# Altium footprint library Devkit.PcbLib: 84 footprints (part 3 of 6)
Each footprint in its own frame and in the unit in brackets; x right, y up, seen from the top. Pads: shape width x height; smd on the part's side, far side on the other; paste and mask are expansions set on the pad; w line width, h text height; cw(c..) or ccw(c..) is an arc to the next point about the centre after c.
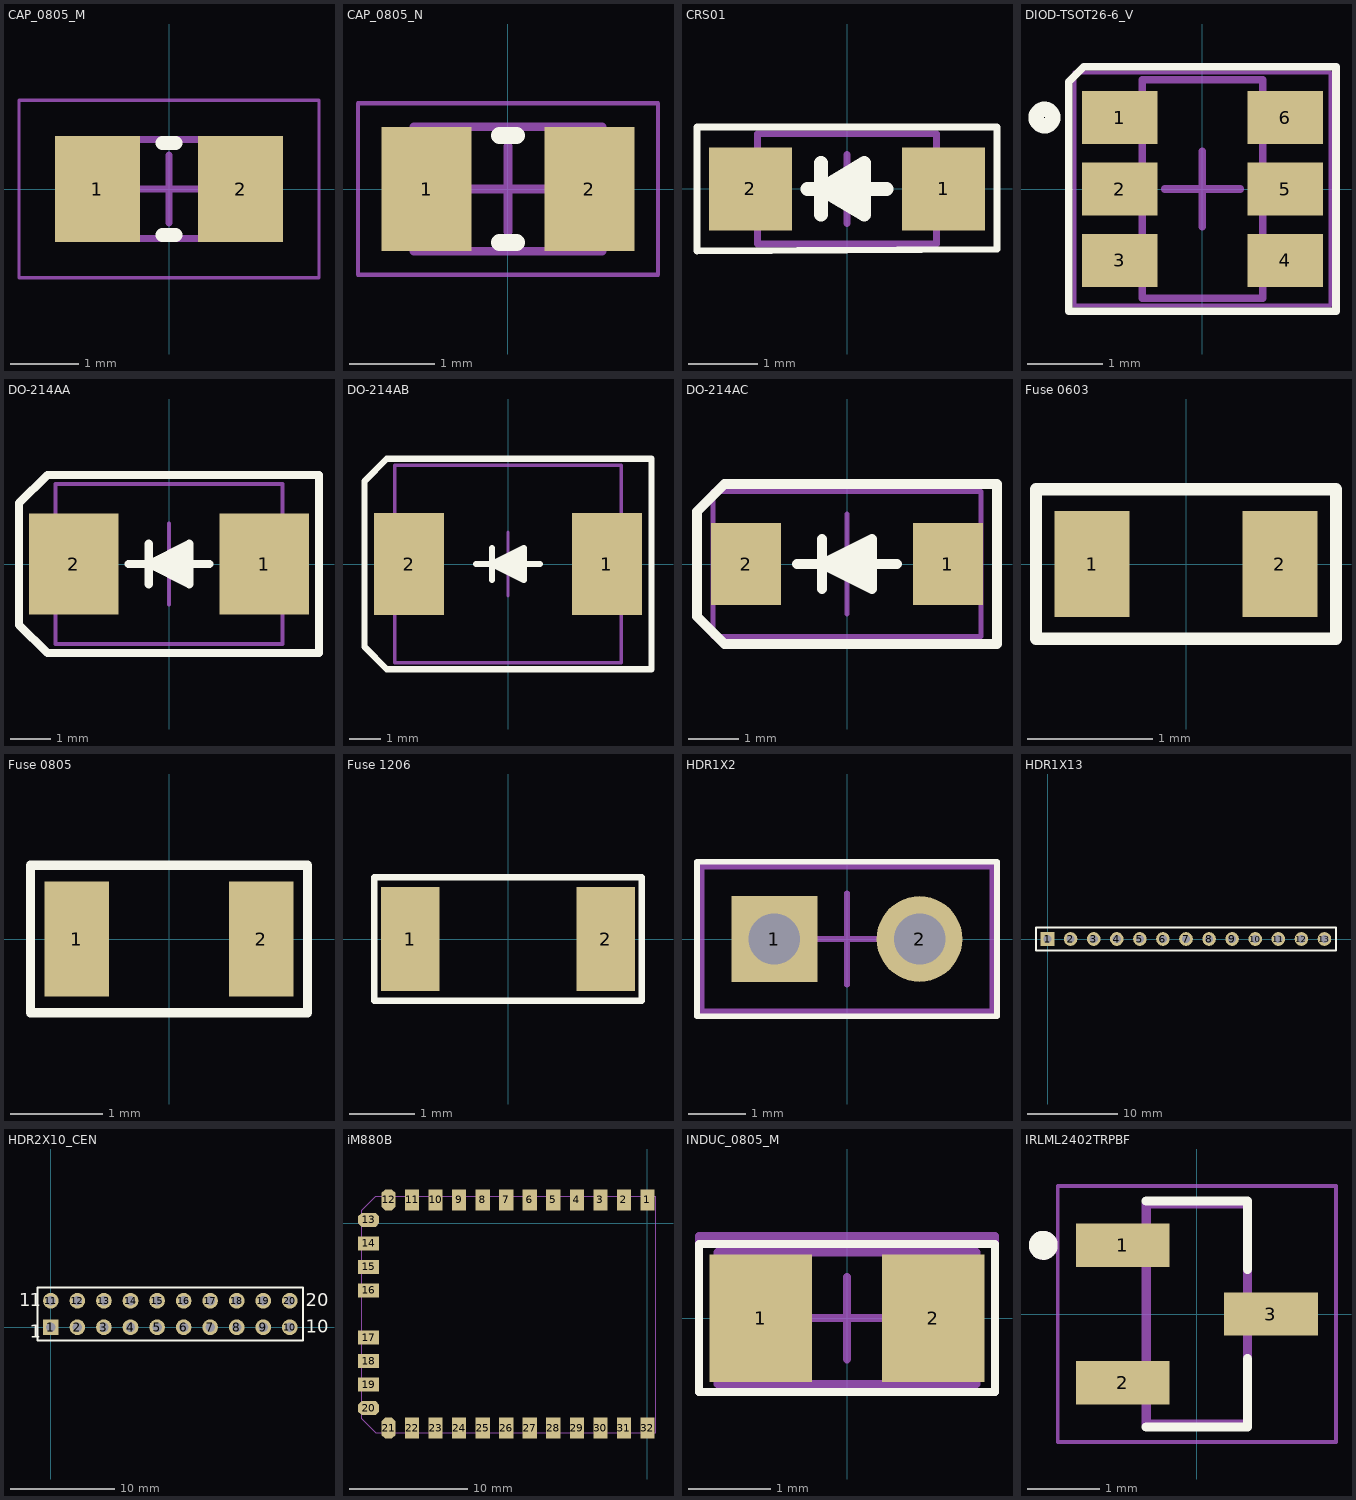
[diagram p2: the footprints below, top view; thin cyan lines are the x and y axes]

## CAP_0805_M [mm] "Chip Capacitor, Body 2.0x1.2mm, Height 1.45mm, IPC Low Density"
height 1.45
pads (2):
  rect 1.25x1.55 smd: 1(-1.05,0) 2(1.05,0)
Top Overlay:
  lines w0.2: -0.1,-0.675 0.1,-0.675 ; -0.1,0.675 0.1,0.675
Mechanical 13:
  lines w0.1: -1.1,-0.725 -1.1,0.725 1.1,0.725 1.1,-0.725 -1.1,-0.725
Mechanical 15:
  lines w0.05: -2.2,-1.3 -2.2,1.3 2.2,1.3 2.2,-1.3 -2.2,-1.3
  lines w0.1: -0.5,0 0.5,0 ; 0,-0.5 0,0.5
3D body: height 1.45, standoff 0, extent -0.6,-0.725 0.6,0.725
3D body: height 1.45, standoff 0, extent -1.1,-0.725 -0.6,0.725
3D body: height 1.45, standoff 0, extent 0.6,-0.725 1.1,0.725

## CAP_0805_N [mm] "Chip Capacitor, Body 2.0x1.2mm, Height 1.45mm, IPC Medium Density"
height 1.45
pads (2):
  rect 1.05x1.45 smd: 1(-0.95,0) 2(0.95,0)
Top Overlay:
  lines w0.2: -0.1,-0.625 0.1,-0.625 ; -0.1,0.625 0.1,0.625
Mechanical 13:
  lines w0.1: -1.1,-0.725 -1.1,0.725 1.1,0.725 1.1,-0.725 -1.1,-0.725
Mechanical 15:
  lines w0.05: -1.75,-1 -1.75,1 1.75,1 1.75,-1 -1.75,-1
  lines w0.1: -0.5,0 0.5,0 ; 0,-0.5 0,0.5
3D body: height 1.45, standoff 0, extent -0.6,-0.725 0.6,0.725
3D body: height 1.45, standoff 0, extent -1.1,-0.725 -0.6,0.725
3D body: height 1.45, standoff 0, extent 0.6,-0.725 1.1,0.725

## CRS01 [mm]
pads (2):
  rect 1.2x1.2 smd: 1(1.4,0) 2(-1.4,0)
Top Overlay:
  lines w0.1: -2.175,-0.903 2.175,-0.875 2.175,0.9 -2.175,0.9 -2.175,-0.903
  lines w0.2: -0.575,0 0.575,0 ; -0.375,-0.375 -0.375,0.375 ; 0,0 0.25,0.375 ; 0,0 0.25,0.375 ; 0,0 0.25,-0.375 ; 0.25,-0.375 0.25,0.375 ; 0.25,-0.375 -0.375,0 0.25,0.375
Mechanical 13:
  lines w0.1: -1.3,-0.8 -1.3,0.8 1.3,0.8 1.3,-0.8 -1.3,-0.8
Mechanical 15:
  lines w0.1: -0.5,0 0.5,0 ; 0,-0.5 0,0.5 ; -1.3,-0.8 -1.3,0.8 1.3,0.8 1.3,-0.8 -1.3,-0.8
3D body "User Library-TUMD2.STEP": height 0.81, standoff 0, extent -1.255,-0.65 1.245,0.65

## DIOD-TSOT26-6_V [mm] "SOT23, 6-Leads, Body 2.90x2.80mm, Pitch 0.95mm"
height 1
pads (6):
  rect 1x0.7 smd: 1(-1.099,0.95) 2(-1.099,0) 3(-1.099,-0.95) 4(1.099,-0.95) 5(1.099,0) 6(1.099,0.95)
Top Overlay:
  circle w0.2: c-2.1,0.95 r0.112
  lines w0.1: -1.775,-1.625 1.775,-1.625 1.775,1.625 -1.575,1.625 -1.775,1.425 -1.775,-1.625
Mechanical 13:
  lines w0.1: -0.8,-1.45 0.8,-1.45 0.8,1.45 -0.8,1.45 -0.8,-1.45
Mechanical 15:
  lines w0.05: -1.699,-1.55 1.7,-1.55 1.7,1.55 -1.699,1.55 -1.699,-1.55
  lines w0.1: -0.5,0 0.5,0 ; 0,-0.5 0,0.5
3D body "SOT95P280X100-6L.step": height 1, standoff 0, extent -1.4,-1.45 1.4,1.45

## DO-214AA [mm]
pads (2):
  rect 2.2x2.5 smd: 1(2.35,0) 2(-2.35,0)
Top Overlay:
  lines w0.2: -1,0 1,0 ; -0.5,-0.5 -0.5,0.5 ; 0.225,-0.15 0.5,-0.5 ; 0.225,0.15 0.5,0.5 ; -0.3,0 0.4,-0.3 ; -0.3,0 0.4,0.3 ; -0.3,0 0.4,0 0.4,0.3 ; 0.4,-0.3 0.4,0.3 ; 0.4,-0.3 0.05,0 0.4,0.3 ; 0.5,-0.5 0.5,0.5 ; 0.5,-0.5 -0.5,0 0.5,0.5 ; -3.7,-1.5 -3,-2.2 3.7,-2.2 3.7,2.2 -3,2.2 -3.7,1.5 -3.7,-1.5
Mechanical 2:
  lines w0.1: -2.8,-1.975 2.8,-1.975 2.8,1.975 -2.8,1.975 -2.8,-1.975
Mechanical 15:
  lines w0.1: -1,0 1,0 ; 0,-1 0,1 ; -2.8,-1.975 2.8,-1.975 2.8,1.975 -2.8,1.975 -2.8,-1.975
3D body "User Library-DIOM5539X24.STEP": height 2.45, standoff 0.03, extent -2.75,-1.95 2.75,1.95

## DO-214AB [mm]
pads (2):
  rect 2.2x3.2 smd: 1(3.105,0) 2(-3.105,0)
Top Overlay:
  lines w0.2: -1,0 1,0 ; -0.5,-0.5 -0.5,0.5 ; 0.225,-0.15 0.5,-0.5 ; 0.225,0.15 0.5,0.5 ; -0.3,0 0.4,0 0.4,0.3 ; -0.3,0 0.4,0.3 ; -0.3,0 0.4,-0.3 ; 0.4,-0.3 0.05,0 0.4,0.3 ; 0.4,-0.3 0.4,0.3 ; 0.5,-0.5 -0.5,0 0.5,0.5 ; 0.5,-0.5 0.5,0.5 ; -4.5,-2.6 -4.5,2.6 -3.8,3.3 4.5,3.3 4.5,-3.3 -3.8,-3.3 -4.5,-2.6
Mechanical 2:
  lines w0.1: -3.55,-3.1 -3.55,3.1 3.55,3.1 3.55,-3.1 -3.55,-3.1
Mechanical 15:
  lines w0.1: -1,0 1,0 ; 0,-1 0,1 ; -3.55,-3.1 -3.55,3.1 3.55,3.1 3.55,-3.1 -3.55,-3.1
3D body "User Library-DO-214AB-SMC.STEP": height 2.5, standoff 0.05, extent -3.9,-2.95 3.9,2.95

## DO-214AC [mm]
pads (2):
  rect 1.4x1.64 smd: 1(2.015,0) 2(-2.015,0)
Top Overlay:
  lines w0.2: -1,0 1,0 ; -0.5,-0.5 -0.5,0.5 ; 0.225,-0.15 0.5,-0.5 ; 0.225,0.15 0.5,0.5 ; -0.3,0 0.4,0 0.4,0.3 ; -0.3,0 0.4,0.3 ; -0.3,0 0.4,-0.3 ; 0.4,-0.3 0.05,0 0.4,0.3 ; 0.4,-0.3 0.4,0.3 ; 0.5,-0.5 -0.5,0 0.5,0.5 ; 0.5,-0.5 0.5,0.5 ; -3,-1.05 -3,1.05 -2.45,1.6 3,1.6 3,-1.6 -2.45,-1.6 -3,-1.05
Mechanical 2:
  lines w0.1: -2.675,-1.45 -2.675,1.45 2.675,1.45 2.675,-1.45 -2.675,-1.45
Mechanical 15:
  lines w0.05: -2.675,-1.45 -2.675,1.45 2.675,1.45 2.675,-1.45 -2.675,-1.45
  lines w0.1: -1,0 1,0 ; 0,-1 0,1
3D body "User Library-DO-214AC(SMA).STEP": height 2.24, standoff -0.04, extent -2.743,-1.397 2.743,1.397

## Fuse 0603 [mm]
height 0.45
pads (2):
  rect 0.6x0.85 smd: 1(-0.75,0) 2(0.75,0)
Top Overlay:
  lines w0.1: -1.2,-0.6 1.2,-0.6 1.2,0.6 -1.2,0.6 -1.2,-0.6
3D body "SMD F-0603.STEP": height 0.45, standoff -0.01, extent -0.8,-0.4 0.8,0.4

## Fuse 0805 [mm]
height 0.55
pads (2):
  rect 0.7x1.25 smd: 1(-1,0) 2(1,0)
Top Overlay:
  lines w0.1: -1.5,-0.8 -1.5,0.8 1.5,0.8 1.5,-0.8 -1.5,-0.8
3D body "SMD F-0805.STEP": height 0.6, standoff 0, extent -1,-0.625 1,0.625

## Fuse 1206 [mm]
height 0.55
pads (2):
  rect 0.9x1.6 smd mask+0.102: 1(-1.5,0) 2(1.5,0)
Top Overlay:
  lines w0.1: -2.05,-0.95 -2.05,0.95 2.05,0.95 2.05,-0.95 -2.05,-0.95
3D body "SMD F-1206.STEP": height 0.6, standoff 0, extent -1.6,-0.8 1.6,0.8

## HDR1X2 [mm] "Connector; Header; 2 Position"
pads (2):
  rect 1.5x1.5 hole 0.9: 1(-1.27,0)
  round 1.5 hole 0.9: 2(1.27,0)
Top Overlay:
  lines w0.1: -2.625,-1.35 -2.625,1.35 2.625,1.35 2.625,-1.35 -2.625,-1.35
Mechanical 15:
  lines w0.1: -0.8,0 0.8,0 ; 0,-0.8 0,0.8 ; -2.54,-1.27 2.54,-1.27 2.54,1.27 -2.54,1.27 -2.54,-1.27
3D body "jumper.STEP": height 18.28, standoff -3, extent -2.54,-1.25 2.54,1.25

## HDR1X13 [mm] "Connector; Header; 11 Position"
pads (13):
  rect 1.5x1.5 hole 0.9: 1(0,0)
  round 1.5 hole 0.9: 2(2.54,0) 3(5.08,0) 4(7.62,0) 5(10.16,0) 6(12.7,0) 7(15.24,0) 8(17.78,0) 9(20.32,0) 10(22.86,0) 11(25.4,0) 12(27.94,0) 13(30.48,0)
Top Overlay:
  lines w0.2: -1.27,-1.27 31.75,-1.27 31.75,1.27 0.635,1.27 -1.27,1.27 -1.27,-1.27
3D body "Header, Male, 2.54mm, 1x10 (1).STEP": height 8.54, standoff -3, extent -1.27,-1.27 24.13,1.27
3D body "Header, Male, 2.54mm, 1x3 (1).STEP": height 8.54, standoff -3, extent 24.13,-1.27 31.75,1.27

## HDR2X10_CEN [mm] "Connector; Header; 10x2 Position"
pads (20):
  rect 1.5x1.5 hole 0.9: 1(0,0)
  round 1.5 hole 0.9: 2(2.54,0) 3(5.08,0) 4(7.62,0) 5(10.16,0) 6(12.7,0) 7(15.24,0) 8(17.78,0) 9(20.32,0) 10(22.86,0) 11(0,2.54) 12(2.54,2.54) 13(5.08,2.54) 14(7.62,2.54) 15(10.16,2.54) 16(12.7,2.54) 17(15.24,2.54) 18(17.78,2.54) 19(20.32,2.54) 20(22.86,2.54)
Top Overlay:
  lines w0.2: -1.27,-1.27 -1.27,3.81 24.13,3.81 24.13,-1.27 -1.27,-1.27
  text "20" at 24.384,2.032 h1.27
  text "10" at 24.384,-0.508 h1.27
  text "1" at -2.032,2.032 h1.27
  text "1" at -3.048,2.032 h1.27
  text "1" at -2.032,-1.016 h1.27
3D body "Header Female 1x10.STEP": height 8.59, standoff -3.29, extent -1.235,-1.205 24.765,1.27
3D body "Header Female 1x10.STEP": height 8.59, standoff -3.29, extent -1.235,1.303 24.765,3.777

## iM880B [mm]
pads (32):
  rect 1.2x1.8 smd: 1(0,2) 2(-2,2) 3(-4,2) 4(-6,2) 5(-8,2) 6(-10,2) 7(-12,2) 8(-14,2) 9(-16,2) 10(-18,2) 11(-20,2) 22(-20,-17.4) 23(-18,-17.4) 24(-16,-17.4) 25(-14,-17.4) 26(-12,-17.4) 27(-10,-17.4) 28(-8,-17.4) 29(-6,-17.4) 30(-4,-17.4) 31(-2,-17.4) 32(0,-17.4)
  oct 1.2x1.8 smd: 12(-22,2) 21(-22,-17.4)
  oct 1.8x1.2 smd: 13(-23.7,0.3) 20(-23.7,-15.7)
  rect 1.8x1.2 smd: 14(-23.7,-1.7) 15(-23.7,-3.7) 16(-23.7,-5.7) 17(-23.7,-9.7) 18(-23.7,-11.7) 19(-23.7,-13.7)
Mechanical 2:
  lines w0.1: -24.3,-16.6 -23.1,-17.8 0.7,-17.8 0.7,2.3 -23.1,2.3 -24.3,1.1 -24.3,-16.6
3D body: height 2, standoff 0, extent -24.3,-17.8 0.7,2.3

## INDUC_0805_M [mm]
pads (2):
  rect 1.25x1.55 smd: 1(-1.05,0) 2(1.05,0)
Top Overlay:
  lines w0.1: -1.8,-0.9 1.8,-0.9 1.8,0.9 -1.8,0.9 -1.8,-0.9
Mechanical 13:
  lines w0.1: -1.575,-0.8 1.575,-0.8 1.575,0.8 -1.575,0.8 -1.575,-0.8
Mechanical 15:
  lines w0.1: -0.5,0 0.5,0 ; 0,-0.5 0,0.5 ; -1.8,-0.9 -1.8,1 1.8,1 1.8,-0.9 -1.8,-0.9
3D body "User Library-INDC2012X___.STEP": height 1, standoff 0, extent -1,-0.625 1,0.625

## IRLML2402TRPBF [mm]
pads (3):
  rect 1.3x0.6 smd: 1(-1.025,0.95) 2(-1.025,-0.95) 3(1.025,0)
Top Overlay:
  circle w0.2: c-2.125,0.95 r0.1
  lines w0.127: -0.7,-1.564 0.7,-1.564 0.7,-0.62 ; -0.7,1.564 0.7,1.564 0.7,0.62
Mechanical 4:
  circle w0.2: c-2.125,0.95 r0.1
  circle w0.2: c-2.125,0.95 r0.1
  circle w0.2: c-2.125,0.95 r0.1
  circle w0.2: c-2.125,0.95 r0.1
  lines w0.127: -0.7,-1.52 0.7,-1.52 ; -0.7,-1.52 -0.7,1.52 ; -0.7,-1.52 0.7,-1.52 ; -0.7,-1.52 -0.7,1.52 ; -0.7,1.52 0.7,1.52 ; -0.7,1.52 0.7,1.52 ; 0.7,-1.52 0.7,1.52 ; 0.7,-1.52 0.7,1.52
Mechanical 16:
  lines w0.05: -1.925,-1.77 1.925,-1.77 1.925,1.77 -1.925,1.77 -1.925,-1.77
3D body "cdsot23-SM712.stp": height 1.04, standoff -0.02, extent -1.15,-1.46 1.15,1.46